# Altium footprint library ALL.PcbLib: 385 footprints (part 17 of 25)
Each footprint in its own frame and in the unit in brackets; x right, y up, seen from the top. Pads: shape width x height; smd on the part's side, far side on the other; paste and mask are expansions set on the pad; w line width, h text height; cw(c..) or ccw(c..) is an arc to the next point about the centre after c.
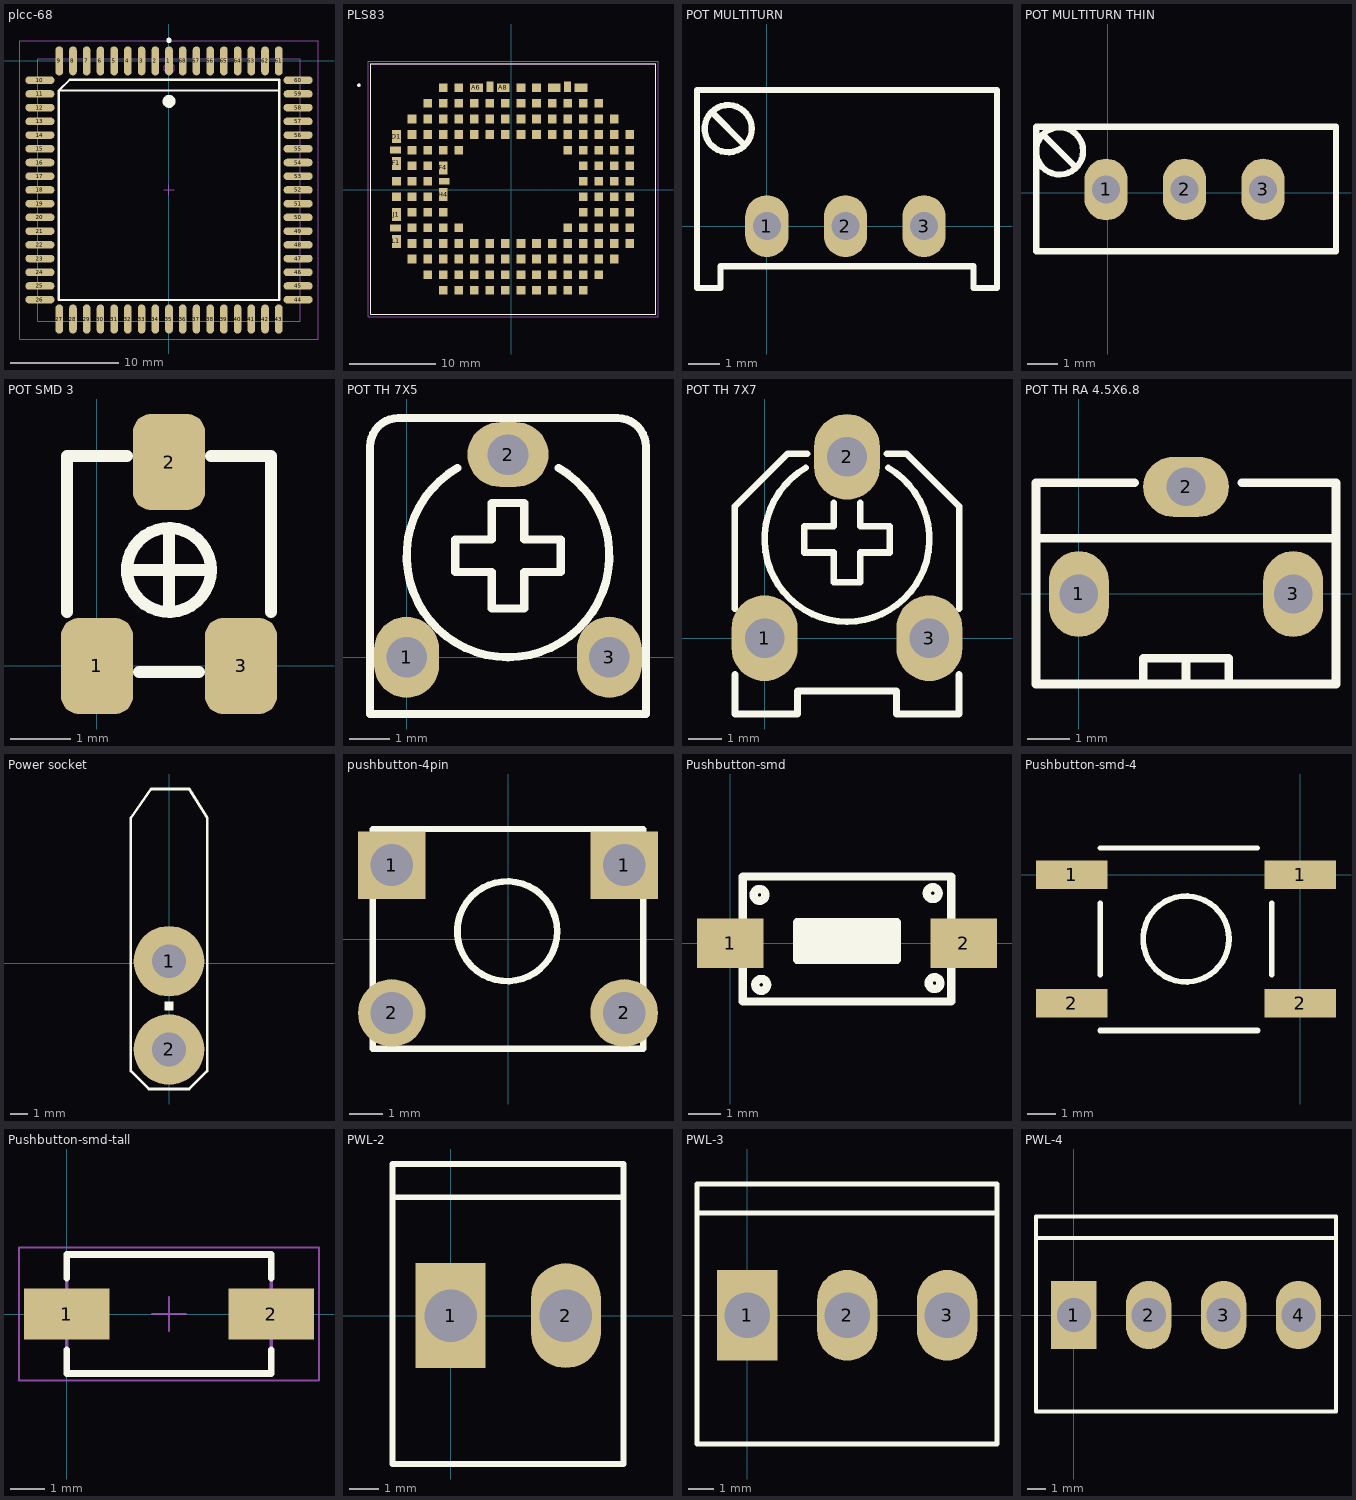
[diagram p16: the footprints below, top view; thin cyan lines are the x and y axes]

## plcc-68 [mm]
pads (68):
  oval 0.7x2.7 smd: 1(0,0) 2(-1.27,0) 3(-2.54,0) 4(-3.81,0) 5(-5.08,0) 6(-6.35,0) 7(-7.62,0) 8(-8.89,0) 9(-10.16,0) 27(-10.16,-23.9) 28(-8.89,-23.9) 29(-7.62,-23.9) 30(-6.35,-23.9) 31(-5.08,-23.9) 32(-3.81,-23.9) 33(-2.54,-23.9) 34(-1.27,-23.9) 35(0,-23.9) 36(1.27,-23.9) 37(2.54,-23.9) 38(3.81,-23.9) 39(5.08,-23.9) 40(6.35,-23.9) 41(7.62,-23.9) 42(8.89,-23.9) 43(10.16,-23.9) 61(10.16,0) 62(8.89,0) 63(7.62,0) 64(6.35,0) 65(5.08,0) 66(3.81,0) 67(2.54,0) 68(1.27,0)
  oval 2.7x0.7 smd: 10(-11.95,-1.79) 11(-11.95,-3.06) 12(-11.95,-4.33) 13(-11.95,-5.6) 14(-11.95,-6.87) 15(-11.95,-8.14) 16(-11.95,-9.41) 17(-11.95,-10.68) 18(-11.95,-11.95) 19(-11.95,-13.22) 20(-11.95,-14.49) 21(-11.95,-15.76) 22(-11.95,-17.03) 23(-11.95,-18.3) 24(-11.95,-19.57) 25(-11.95,-20.84) 26(-11.95,-22.11) 44(11.95,-22.11) 45(11.95,-20.84) 46(11.95,-19.57) 47(11.95,-18.3) 48(11.95,-17.03) 49(11.95,-15.76) 50(11.95,-14.49) 51(11.95,-13.22) 52(11.95,-11.95) 53(11.95,-10.68) 54(11.95,-9.41) 55(11.95,-8.14) 56(11.95,-6.87) 57(11.95,-5.6) 58(11.95,-4.33) 59(11.95,-3.06) 60(11.95,-1.79)
Top Overlay:
  circle w0.6: c0,-3.75 r0.3
  circle w0.25: c0,1.9 r0.125
  lines w0.2: 10.2,-2.75 -10.2,-2.75 ; -10.2,-2.75 -10.2,-22.15 10.2,-22.15 10.2,-1.75 -9.2,-1.75 -10.2,-2.75
Mechanical 13:
  circle w0.1: c0,-0.685 r0.5
  lines w0.1: -12.165,-24.115 12.165,-24.115 12.165,0.215 -12.165,0.215 -12.165,-24.115
Mechanical 15:
  lines w0.1: -0.5,-11.95 0.5,-11.95 ; 0,-12.45 0,-11.45 ; -13.8,-25.75 13.8,-25.75 13.8,1.85 -13.8,1.85 -13.8,-25.75
3D body "User Library-8051 MCU PLCC 68-pin package.STEP": height 4.38, standoff 0, extent -12.624,-24.587 12.522,0.559

## PLS83 [mm]
pads (156):
  rect 1x1 smd paste+0.095: A4(-7.897,11.802) A5(-6.097,11.802) A9(1.103,11.802) A10(2.903,11.802) B3(-9.697,10.002) B4(-7.897,10.002) B5(-6.097,10.002) B6(-4.297,10.002) B7(-2.497,10.002) B8(-0.697,10.002) B9(1.103,10.002) B10(2.903,10.002) B11(4.703,10.002) B12(6.503,10.002) B13(8.303,10.002) B14(10.103,10.002) C2(-11.497,8.202) C3(-9.697,8.202) C4(-7.897,8.202) C5(-6.097,8.202) C6(-4.297,8.202) C7(-2.497,8.202) C8(-0.697,8.202) C9(1.103,8.202) C10(2.903,8.202) C11(4.703,8.202) C12(6.503,8.202) C13(8.303,8.202) C14(10.103,8.202) C15(11.903,8.202) D2(-11.497,6.402) D3(-9.697,6.402) D4(-7.897,6.402) D5(-6.097,6.402) D6(-4.297,6.402) D7(-2.497,6.402) D8(-0.697,6.402) D9(1.103,6.402) D10(2.903,6.402) D11(4.703,6.402) D12(6.503,6.402) D13(8.303,6.402) D14(10.103,6.402) D15(11.903,6.402) D16(13.703,6.402) E2(-11.497,4.602) E3(-9.697,4.602) E4(-7.897,4.602) E5(-6.097,4.602) E12(6.503,4.602) E13(8.303,4.602) E14(10.103,4.602) E15(11.903,4.602) E16(13.703,4.602) F2(-11.497,2.802) F3(-9.697,2.802) F13(8.303,2.802) F14(10.103,2.802) F15(11.903,2.802) F16(13.703,2.802) G1(-13.297,1.002) G2(-11.497,1.002) G3(-9.697,1.002) G13(8.303,1.002) G14(10.103,1.002) G15(11.903,1.002) G16(13.703,1.002) H1(-13.297,-0.798) H2(-11.497,-0.798) H3(-9.697,-0.798) H13(8.303,-0.798) H14(10.103,-0.798) H15(11.903,-0.798) H16(13.703,-0.798) J2(-11.497,-2.598) J3(-9.697,-2.598) J4(-7.897,-2.598) J13(8.303,-2.598) J14(10.103,-2.598) J15(11.903,-2.598) J16(13.703,-2.598) K2(-11.497,-4.398) K3(-9.697,-4.398) K4(-7.897,-4.398) K5(-6.097,-4.398) K12(6.503,-4.398) K13(8.303,-4.398) K14(10.103,-4.398) K15(11.903,-4.398) K16(13.703,-4.398) L2(-11.497,-6.198) L3(-9.697,-6.198) L4(-7.897,-6.198) L5(-6.097,-6.198) L6(-4.297,-6.198) L7(-2.497,-6.198) L8(-0.697,-6.198) L9(1.103,-6.198) L10(2.903,-6.198) L11(4.703,-6.198) L12(6.503,-6.198) L13(8.303,-6.198) L14(10.103,-6.198) L15(11.903,-6.198) L16(13.703,-6.198) M2(-11.497,-7.998) M3(-9.697,-7.998) M4(-7.897,-7.998) M5(-6.097,-7.998) M6(-4.297,-7.998) M7(-2.497,-7.998) M8(-0.697,-7.998) M9(1.103,-7.998) M10(2.903,-7.998) M11(4.703,-7.998) M12(6.503,-7.998) M13(8.303,-7.998) M14(10.103,-7.998) M15(11.903,-7.998) N3(-9.697,-9.798) N4(-7.897,-9.798) N5(-6.097,-9.798) N6(-4.297,-9.798) N7(-2.497,-9.798) N8(-0.697,-9.798) N9(1.103,-9.798) N10(2.903,-9.798) N11(4.703,-9.798) N12(6.503,-9.798) N13(8.303,-9.798) N14(10.103,-9.798) P4(-7.897,-11.598) P5(-6.097,-11.598) P6(-4.297,-11.598) P7(-2.497,-11.598) P8(-0.697,-11.598) P9(1.103,-11.598) P10(2.903,-11.598) P11(4.703,-11.598) P12(6.503,-11.598) P13(8.303,-11.598)
  rect 1.5x1 smd paste-2: A6(-4.047,11.802) A8(-0.947,11.802) A11(4.953,11.802) A13(8.053,11.802)
  rect 0.8x1.25 smd paste-2: A7(-2.497,11.927) A12(6.503,11.927)
  rect 1x1.5 smd paste-2: D1(-13.297,6.152) F1(-13.297,3.052) F4(-7.897,2.552) H4(-7.897,-0.548) J1(-13.297,-2.848) L1(-13.297,-5.948)
  rect 1.25x0.8 smd paste-2: E1(-13.422,4.602) G4(-7.772,1.002) K1(-13.422,-4.398)
Top Overlay:
  circle w0.2: c-17.647,12.107 r0.1
  lines w0.127: -16.297,-14.398 -16.297,14.602 16.703,14.602 16.703,-14.398 -16.297,-14.398
Top Paste:
  region: 8.853,11.202 7.253,11.202 7.253,12.402 8.853,12.402
  region: 6.903,11.102 6.103,11.102 6.103,12.752 6.903,12.752
  region: 5.753,11.202 4.153,11.202 4.153,12.402 5.753,12.402
  region: -0.147,11.202 -1.747,11.202 -1.747,12.402 -0.147,12.402
  region: -2.097,11.102 -2.897,11.102 -2.897,12.752 -2.097,12.752
  region: -3.247,11.202 -4.847,11.202 -4.847,12.402 -3.247,12.402
  region: -7.297,1.752 -8.497,1.752 -8.497,3.352 -7.297,3.352
  region: -12.697,5.352 -13.897,5.352 -13.897,6.952 -12.697,6.952
  region: -12.697,2.252 -13.897,2.252 -13.897,3.852 -12.697,3.852
  region: -12.697,-6.748 -13.897,-6.748 -13.897,-5.148 -12.697,-5.148
  region: -12.697,-3.648 -13.897,-3.648 -13.897,-2.048 -12.697,-2.048
  region: -12.597,4.202 -14.247,4.202 -14.247,5.002 -12.597,5.002
  region: -12.597,-4.798 -14.247,-4.798 -14.247,-3.998 -12.597,-3.998
  region: -6.947,0.602 -8.597,0.602 -8.597,1.402 -6.947,1.402
  region: -7.297,-1.348 -8.497,-1.348 -8.497,0.252 -7.297,0.252
Mechanical 13:
  circle w0.2: c-17.647,12.107 r0.1
  lines w0.127: -16.297,-14.398 -16.297,14.602 16.703,14.602 16.703,-14.398 -16.297,-14.398
Mechanical 15:
  lines w0.05: -16.547,-14.648 -16.547,14.852 16.953,14.852 16.953,-14.648 -16.547,-14.648
3D body "step_temp.STEP": height 2.5, standoff 0, extent -16.297,-14.398 16.703,14.602

## POT MULTITURN [mm]
pads (3):
  oval 1.4x2 / inner round 1.2 / far side oval 1.4x2 hole 0.9: 1(0,0) 2(2.54,0) 3(5.08,0)
Top Overlay:
  circle w0.2: c-1.251,3.151 r0.762
  lines w0.2: -1.759,3.659 -0.743,2.643 ; -2.26,-2 -2.26,4.4 7.44,4.4 7.44,-2 6.685,-2 6.685,-1.3 -1.505,-1.3 -1.505,-2 -2.26,-2
3D body "pot 3299W-1-103RLF.step": height 11.56, standoff -6.22, extent -2.185,-1.848 7.34,4.248

## POT MULTITURN THIN [mm]
pads (3):
  oval 1.4x2 / inner round 1.2 / far side oval 1.4x2 hole 0.9: 1(-0.051,0.102) 2(2.489,0.102) 3(5.029,0.102)
Top Overlay:
  circle w0.2: c-1.556,1.348 r0.762
  lines w0.2: -2.064,1.856 -1.048,0.84 ; -2.311,-1.898 -2.311,2.134 7.389,2.134 7.389,-1.898 6.634,-1.898 -1.556,-1.898 -2.311,-1.898
3D body "mul.stp": height 11.41, standoff -7.38, extent -2.4,-1.905 7.379,2.108

## POT SMD 3 [mm]
pads (3):
  rrect50% 1.2x1.6 smd: 1(0,0) 2(1.2,3.4) 3(2.4,0)
Top Overlay:
  circle w0.2: c1.2,1.6 r0.7
  lines w0.2: -0.5,0.9 -0.5,3.5 0.5,3.5 ; 0.5,1.6 1.9,1.6 ; 0.7,-0.1 1.7,-0.1 ; 1.2,0.9 1.2,2.3 ; 1.9,3.5 2.9,3.5 2.9,0.9
3D body "User Library-PVZ3A.STEP": height 1.95, standoff 0, extent -0.35,-0.25 2.75,3.44

## POT TH 7X5 [mm]
pads (3):
  oval 1.6x2 hole 1: 1(0,0) 3(5,0)
  oval 2x1.6 hole 1: 2(2.5,5)
Top Overlay:
  lines w0.2: 1.25,4.665 ccw(c2.5,2.5) 3.75,4.665 ; -0.9,-1.4 5.9,-1.4 5.9,5.2 ccw(c5.2,5.2) 5.2,5.9 -0.2,5.9 ccw(c-0.2,5.2) -0.9,5.2 -0.9,-1.4 ; 1.2,2.1 2.1,2.1 2.1,1.2 2.9,1.2 2.9,2.1 3.8,2.1 3.8,2.9 2.9,2.9 2.9,3.8 2.1,3.8 2.1,2.9 1.2,2.9 1.2,2.1
3D body "User Library-Pot - RES_VAR1.STEP": height 7, standoff -3.9, extent -0.75,-1.275 5.75,5.775

## POT TH 7X7 [mm]
pads (3):
  oval 2x2.6 hole 1.2: 1(0,0) 2(2.5,5.5) 3(5,0)
Top Overlay:
  lines w0.2: -0.9,0.9 -0.9,4 0.7,5.6 1.3,5.6 ; 1.25,5.165 ccw(c2.5,3) 3.75,5.165 ; 2.1,4.1 2.1,3.4 1.2,3.4 1.2,2.6 2.1,2.6 2.1,1.7 2.9,1.7 2.9,2.6 3.8,2.6 3.8,3.4 2.9,3.4 2.9,4.1 ; 3.7,5.6 4.3,5.6 5.9,4 5.9,0.9
  lines w0.203: -0.9,-1.1 -0.9,-2.3 1,-2.3 1,-1.6 4,-1.6 4,-2.3 5.9,-2.3 5.9,-1.1
3D body "Trimmer, 3306F.step": height 7.62, standoff -3.04, extent -0.905,-2.376 5.905,6.29

## POT TH RA 4.5X6.8 [mm]
pads (3):
  oval 1.4x2 / inner round 1.2 / far side oval 1.4x2 hole 0.9: 1(0,0) 3(5,0)
  oval 2x1.4 / inner round 1.2 / far side oval 2x1.4 hole 0.9: 2(2.5,2.5)
Top Overlay:
  lines w0.2: 1.3,2.6 -1,2.6 -1,1.3 ; 1.5,-2.1 1.5,-1.5 2.5,-1.5 ; 2.5,-2.1 2.5,-1.5 ; 3.5,-2 3.5,-1.5 2.5,-1.5 ; 3.8,2.6 6,2.6 6,1.3 ; -1,1.3 6,1.3 ; -1,1.3 -1,-2.1 6,-2.1 6,1.3
3D body "User Library-POT-3306W.step": height 8.4, standoff -1.91, extent -0.905,-2 5.905,2.65

## Power socket [mm]
pads (2):
  round 4 hole 1.9: 1(-0.025,0.127) 2(-0.025,-4.873)
Top Overlay:
  region: -0.279,-2.159 -0.279,-2.667 0.229,-2.667 0.229,-2.159
  region: -0.279,0.381 -0.279,-0.127 0.229,-0.127 0.229,0.381
  lines w0.152: -2.184,-6.096 -2.184,-2.286 -2.184,8.255 -1.041,9.888 1.118,9.888 2.134,8.255 2.134,-0.381 2.134,-2.667 2.134,-6.096 1.118,-7.112 -1.168,-7.112 -2.184,-6.096

## pushbutton-4pin [mil]
pads (4):
  rect 80x80 hole 50: 1(-137.5,87.5) 1(137.5,87.5)
  round 80 hole 50: 2(-137.5,-87.5) 2(137.5,-87.5)
Top Overlay:
  circle w7.87: c-0.89,9.15 r59.06
  lines w7: -160,130 160,130
  lines w7.87: -160,130 -160,-130 160,-130 160,130
3D body "SW3dPS-Touche DTS-6X_V2008.STEP": height 205.04, standoff -120.04, extent -154.9,-121.09 156.9,123

## Pushbutton-smd [mil]
pads (2):
  rect 80x59.06 smd: 1(0,0) 2(280,0)
Top Overlay:
  circle w10: c245,-47.93 r7.07
  circle w10: c37.07,-50 r7.07
  circle w10: c35,57.93 r7.07
  circle w10: c242.93,60 r7.07
  rectangle: 80,-20 200,25
  lines w10: 15,-25 15,-70 265,-70 265,-25 ; 15,25 15,80 265,80 265,25 ; 80,-20 200,-20 200,25 80,25 80,-20
3D body "Switch.STEP": height 75.41, standoff 0.6, extent -28.19,-69.06 308.2,79.36

## Pushbutton-smd-4 [mm]
pads (4):
  rect 2.5x1 smd: 1(-7.985,0) 1(0,0) 2(-7.985,-4.5) 2(0,-4.5)
Top Overlay:
  circle w0.2: c-3.992,-2.25 r1.5
  lines w0.178: -6.99,0.925 -1.49,0.925
  lines w0.2: -6.992,-3.5 -6.992,-1 ; -6.99,-5.45 -1.49,-5.45 ; -0.992,-3.5 -0.992,-1
3D body "SW3dPS-switch.STEP": height 5, standoff 0, extent -8.492,-5.25 0.508,0.75

## Pushbutton-smd-tall [mm]
pads (2):
  rect 2.5x1.5 smd: 1(0,0) 2(6,0)
Top Overlay:
  lines w0.2: 0,-1.05 0,-1.75 6,-1.75 6,-1.05 ; 0,1.05 0,1.75 6,1.75 6,1.05
Mechanical 13:
  lines w0.1: 0,-1.75 6,-1.75 6,1.75 0,1.75 0,-1.75
Mechanical 15:
  lines w0.05: 2.5,0 3.5,0 ; 3,-0.5 3,0.5 ; -1.4,-1.95 -1.4,1.95 7.4,1.95 7.4,-1.95 -1.4,-1.95
3D body "4341x30438x6.stp": height 4.3, standoff 0, extent -0.649,-1.75 6.65,1.75

## PWL-2 [mm]
pads (2):
  rect 2.4x3.6 hole 1.8: 1(0,0)
  oval 2.4x3.6 hole 1.8: 2(3.96,0)
Top Overlay:
  lines w0.2: -2,4.064 5.94,4.064 ; -2,-5.1 -2,5.207 5.94,5.207 5.94,-5.1 -2,-5.1
3D body "PWL-2.stp": height 13.5, standoff -4, extent -1.98,-5 5.94,5

## PWL-3 [mm]
pads (3):
  rect 2.4x3.6 hole 1.8: 1(0,0)
  oval 2.4x3.6 hole 1.8: 2(3.96,0) 3(7.92,0)
Top Overlay:
  lines w0.2: -2,4.064 9.9,4.064 ; -2,-5.1 -2,5.207 9.9,5.207 9.9,-5.1 -2,-5.1
3D body "PWL-3.stp": height 13.5, standoff -4, extent -1.98,-5 9.9,5

## PWL-4 [mm]
pads (4):
  rect 2.4x3.6 hole 1.8: 1(0,0)
  oval 2.4x3.6 hole 1.8: 2(3.96,0) 3(7.92,0) 4(11.88,0)
Top Overlay:
  lines w0.2: -2,4.064 13.86,4.064 ; -2,-5.1 13.86,-5.1 13.86,5.207 -2,5.207 -2,-5.1
3D body "PWL-4.stp": height 13.5, standoff -4, extent -1.98,-5 13.86,5